# Altium integrated library Connectors.IntLib: 52 symbols
Pins are listed as number, name and electrical type; pins without a type are passive.

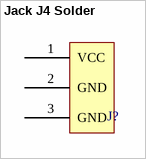
[diagram p0: symbol Jack J4 Solder]

## Jack J4 Solder
designator J?  (value not drawn)
Power Barrel Connector Jack 2.10mm ID (0.083"), 5.50mm OD (0.217") Through Hole, Right Angle; Manufacturer 1: CUI Inc.; Manufacturer 1 PN: PJ-002A; Supplier 1: Digi-Key; Supplier 2: Arrow; Supplier 3: Mouser; Supplier Part Number 1: CP-002A-ND; Supplier Part Number 2: PJ-002A; Supplier Part Number 3: 490-PJ-002A
footprint Jack J4 Solder (Power Barrel Connector Jack 2.10mm ID (0.083"), 5.50mm OD (0.217") Through Hole, Right Angle)
pins: 1 VCC (power), 2 GND (power), 3 GND (power)


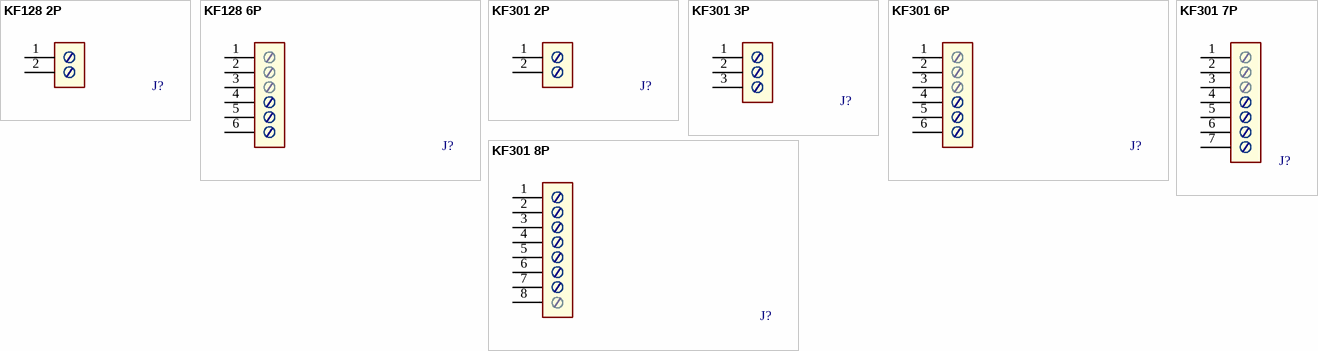
[diagram p1: symbols KF128 2P to KF301 8P]

## KF128 2P
designator J?, comment 2-Ways Wire-to-Board Horizontal  (value not drawn)
2 Position Wire to Board Terminal Block Horizontal with Board 0.200" (5.08mm) Through Hole; Manufacturer 1: Amphenol Anytek; Manufacturer 1 PN: VI0221520000G; ComponentLink1Description: Datasheet; ComponentLink1URL: http://www.on-shore.com/wp-content/uploads/2015/09/OSTTAXX4163.pdf; Digikey PN: 609-3936-ND; Mouser PN: 649-VI02215200J0G
footprint KF128 2P (2 Position Wire to Board Terminal Block Horizontal with Board 0.200" (5.08mm) Through Hole)
pins: 1, 2

## KF128 6P
designator J?, comment 6-Ways Wire-to-Board Horizontal  (value not drawn)
6 Position Wire to Board Terminal Block Horizontal with Board 0.200" (5.08mm) Through Hole; Manufacturer 1: Amphenol Anytek; Manufacturer 1 PN: VI0621550000G; ComponentLink1Description: Datasheet; ComponentLink1URL: http://www.on-shore.com/wp-content/uploads/2015/09/ed120ds.pdf; Digikey PN: 609-3940-ND; Mouser PN: 649-220316-H061B01LF
footprint KF128 6P (6 Position Wire to Board Terminal Block Horizontal with Board 0.200" (5.08mm) Through Hole)
pins: 1 (power), 2 (power), 3 (power), 4 (power), 5 (power), 6 (power)

## KF301 2P
designator J?, comment 2-Ways Wire-to-Board Horizontal  (value not drawn)
2 Position Wire to Board Terminal Block Horizontal with Board 0.200" (5.08mm) Through Hole; Manufacturer 1: On Shore Technology Inc.; Manufacturer 1 PN: OSTTA024163; ComponentLink1Description: Datasheet; ComponentLink1URL: http://www.on-shore.com/wp-content/uploads/2015/09/OSTTAXX4163.pdf; Digikey PN: ED2580-ND
footprint KF301 2P (2 Position Wire to Board Terminal Block Horizontal with Board 0.200" (5.08mm) Through Hole)
pins: 1, 2

## KF301 3P
designator J?, comment 3-Ways Wire-to-Board Horizontal  (value not drawn)
3 Position Wire to Board Terminal Block Horizontal with Board 0.200" (5.08mm) Through Hole; Manufacturer 1: On Shore Technology Inc.; Manufacturer 1 PN: OSTTC032162; ComponentLink1Description: Datasheet; ComponentLink1URL: http://www.on-shore.com/wp-content/uploads/2015/09/ed120ds.pdf; Digikey PN: ED2610-ND
footprint KF301 3P (3 Position Wire to Board Terminal Block Horizontal with Board 0.200" (5.08mm) Through Hole)
pins: 1, 2, 3 (power)

## KF301 6P
designator J?, comment 6-Ways Wire-to-Board Horizontal  (value not drawn)
6 Position Wire to Board Terminal Block Horizontal with Board 0.200" (5.08mm) Through Hole; Manufacturer 1: On Shore Technology Inc.; Manufacturer 1 PN: OSTTC062162; ComponentLink1Description: Datasheet; ComponentLink1URL: http://www.on-shore.com/wp-content/uploads/2015/09/ed120ds.pdf; Digikey PN: ED2613-ND
footprint KF301 6P (6 Position Wire to Board Terminal Block Horizontal with Board 0.200" (5.08mm) Through Hole)
pins: 1 (power), 2 (power), 3 (power), 4 (power), 5 (power), 6 (power)

## KF301 7P
designator J?, comment 7-Ways Wire-to-Board Horizontal  (value not drawn)
7 Position Wire to Board Terminal Block Horizontal with Board 0.200" (5.08mm) Through Hole; Manufacturer 1: On Shore Technology Inc.; Manufacturer 1 PN: OSTTC072162; ComponentLink1Description: Datasheet; ComponentLink1URL: http://www.on-shore.com/wp-content/uploads/2015/09/ed120ds.pdf; Digikey PN: ED2614-ND
footprint KF301 7P (7 Position Wire to Board Terminal Block Horizontal with Board 0.200" (5.08mm) Through Hole)
pins: 1 (power), 2 (power), 3 (power), 4 (power), 5 (power), 6 (power), 7 (power)

## KF301 8P
designator J?, comment 8-Ways Wire-to-Board Horizontal  (value not drawn)
8 Position Wire to Board Terminal Block Horizontal with Board 0.200" (5.08mm) Through Hole; Manufacturer 1: On Shore Technology Inc.; Manufacturer 1 PN: OSTTC082162; ComponentLink1Description: Datasheet; ComponentLink1URL: http://www.on-shore.com/wp-content/uploads/2015/09/ed120ds.pdf; Digikey PN: ED2615-ND
footprint KF301 8P (8 Position Wire to Board Terminal Block Horizontal with Board 0.200" (5.08mm) Through Hole)
pins: 1 (power), 2 (power), 3 (power), 4 (power), 5 (power), 6 (power), 7 (power), 8 (power)


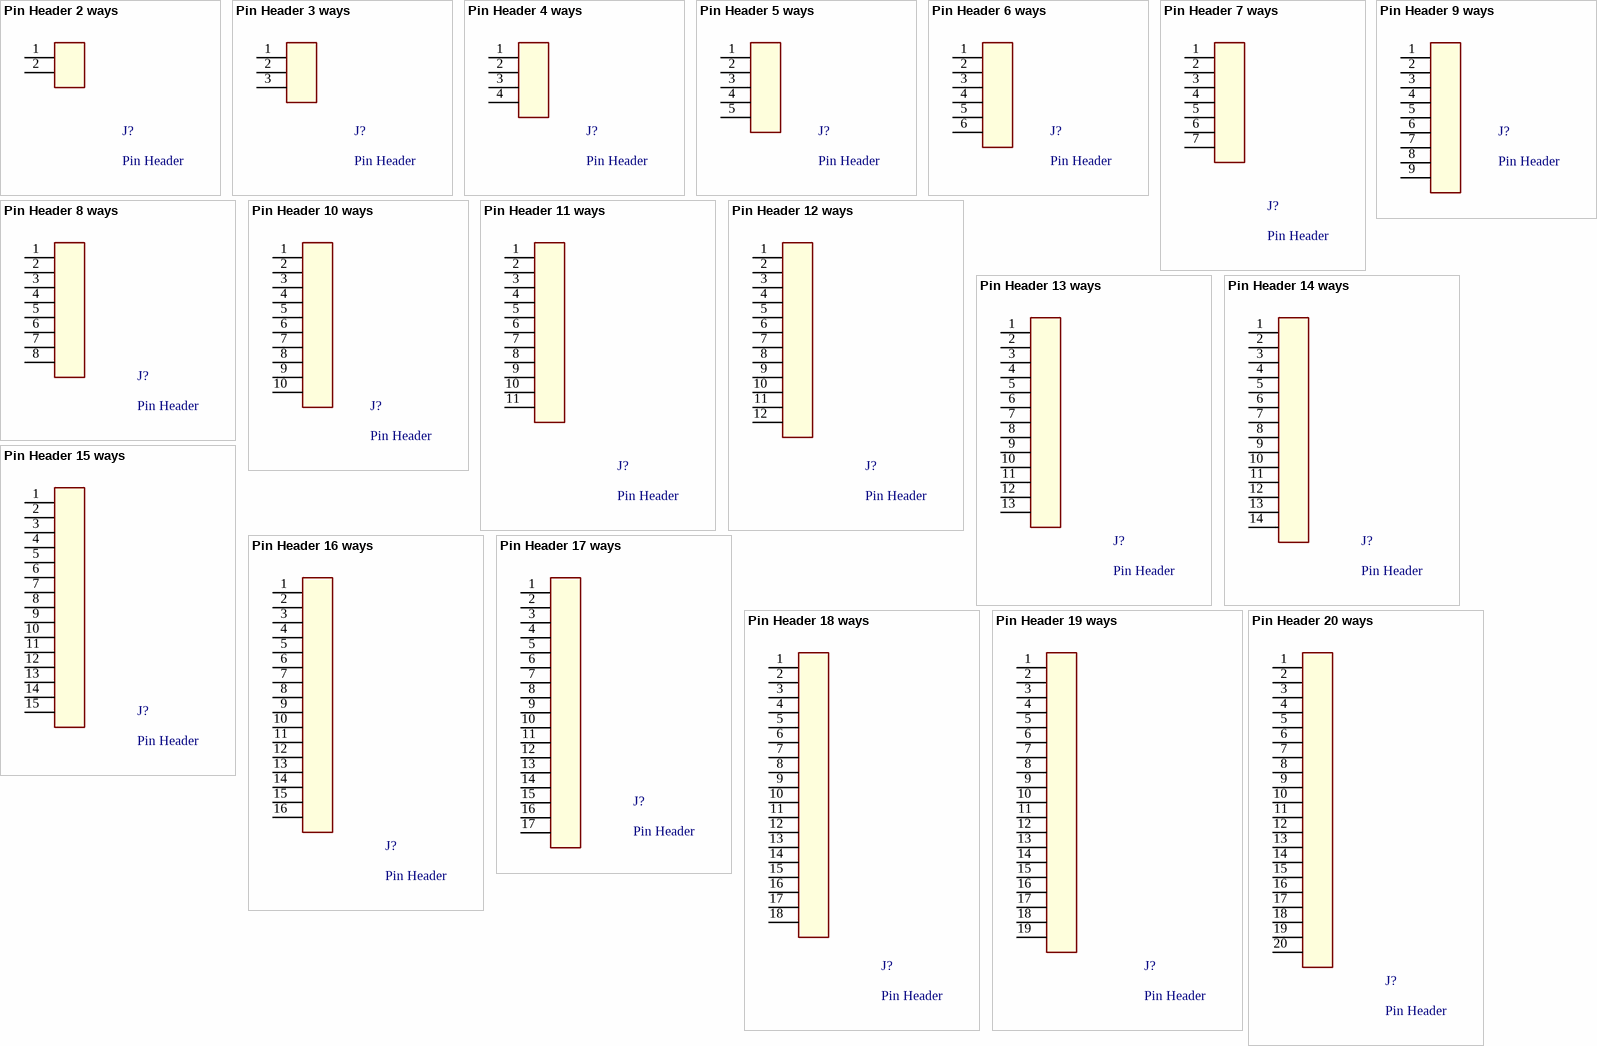
[diagram p2: symbols Pin Header 2 ways to Pin Header 20 ways]

## Pin Header 2 ways
designator J?, comment Pin Header
Connector Header PTH 0.100" (2.54mm); Manufacturer 1: Irwin Inc.; Manufacturer 1 PN: M20-9992046
footprint Pin Header 2 ways (Connector Header 2 ways PTH 0.100" (2.54mm))
pins: 1, 2

## Pin Header 3 ways
designator J?, comment Pin Header
Connector Header PTH 0.100" (2.54mm); Manufacturer 1: Irwin Inc.; Manufacturer 1 PN: M20-9992046
footprint Pin Header 3 Ways (Connector Header 3 ways PTH 0.100" (2.54mm))
pins: 1, 2, 3

## Pin Header 4 ways
designator J?, comment Pin Header
Connector Header PTH 0.100" (2.54mm); Manufacturer 1: Irwin Inc.; Manufacturer 1 PN: M20-9992046
footprint Pin Header 4 Ways (Connector Header 4 ways PTH 0.100" (2.54mm))
pins: 1, 2, 3, 4

## Pin Header 5 ways
designator J?, comment Pin Header
Connector Header PTH 0.100" (2.54mm); Manufacturer 1: Irwin Inc.; Manufacturer 1 PN: M20-9992046
footprint Pin Header 5 Ways (Connector Header 5 ways PTH 0.100" (2.54mm))
pins: 1, 2, 3, 4, 5

## Pin Header 6 ways
designator J?, comment Pin Header
Connector Header PTH 0.100" (2.54mm); Manufacturer 1: Irwin Inc.; Manufacturer 1 PN: M20-9992046
footprint Pin Header 6 Ways (Connector Header 6 ways PTH 0.100" (2.54mm))
pins: 1, 2, 3, 4, 5, 6

## Pin Header 7 ways
designator J?, comment Pin Header
Connector Header PTH 0.100" (2.54mm); Manufacturer 1: Irwin Inc.; Manufacturer 1 PN: M20-9992046
footprint Pin Header 7 Ways (Connector Header 7 ways PTH 0.100" (2.54mm))
pins: 1, 2, 3, 4, 5, 6, 7

## Pin Header 8 ways
designator J?, comment Pin Header
Connector Header PTH 0.100" (2.54mm); Manufacturer 1: Irwin Inc.; Manufacturer 1 PN: M20-9992046
footprint Pin Header 8 Ways (Connector Header 8 ways PTH 0.100" (2.54mm))
pins: 1, 2, 3, 4, 5, 6, 7, 8

## Pin Header 9 ways
designator J?, comment Pin Header
Connector Header PTH 0.100" (2.54mm); Manufacturer 1: Irwin Inc.; Manufacturer 1 PN: M20-9992046
footprint Pin Header 9 Ways (Connector Header 9 ways PTH 0.100" (2.54mm))
pins: 1, 2, 3, 4, 5, 6, 7, 8, 9

## Pin Header 10 ways
designator J?, comment Pin Header
Connector Header PTH 0.100" (2.54mm); Manufacturer 1: Irwin Inc.; Manufacturer 1 PN: M20-9992046
footprint Pin Header 10 Ways (Connector Header 10 ways PTH 0.100" (2.54mm))
pins: 1, 2, 3, 4, 5, 6, 7, 8, 9, 10

## Pin Header 11 ways
designator J?, comment Pin Header
Connector Header PTH 0.100" (2.54mm); Manufacturer 1: Irwin Inc.; Manufacturer 1 PN: M20-9992046
footprint Pin Header 11 Ways (Connector Header 11 ways PTH 0.100" (2.54mm))
pins: 1, 2, 3, 4, 5, 6, 7, 8, 9, 10, 11

## Pin Header 12 ways
designator J?, comment Pin Header
Connector Header PTH 0.100" (2.54mm); Manufacturer 1: Irwin Inc.; Manufacturer 1 PN: M20-9992046
footprint Pin Header 12 Ways (Connector Header 12 ways PTH 0.100" (2.54mm))
pins: 1, 2, 3, 4, 5, 6, 7, 8, 9, 10, 11, 12

## Pin Header 13 ways
designator J?, comment Pin Header
Connector Header PTH 0.100" (2.54mm); Manufacturer 1: Irwin Inc.; Manufacturer 1 PN: M20-9992046
footprint Pin Header 13 Ways (Connector Header 13 ways PTH 0.100" (2.54mm))
pins: 1, 2, 3, 4, 5, 6, 7, 8, 9, 10, 11, 12, 13

## Pin Header 14 ways
designator J?, comment Pin Header
Connector Header PTH 0.100" (2.54mm); Manufacturer 1: Irwin Inc.; Manufacturer 1 PN: M20-9992046
footprint Pin Header 14 Ways (Connector Header 14 ways PTH 0.100" (2.54mm))
pins: 1, 2, 3, 4, 5, 6, 7, 8, 9, 10, 11, 12, 13, 14

## Pin Header 15 ways
designator J?, comment Pin Header
Connector Header PTH 0.100" (2.54mm); Manufacturer 1: Irwin Inc.; Manufacturer 1 PN: M20-9992046
footprint Pin Header 15 Ways (Connector Header 15 ways PTH 0.100" (2.54mm))
pins: 1, 2, 3, 4, 5, 6, 7, 8, 9, 10, 11, 12, 13, 14, 15

## Pin Header 16 ways
designator J?, comment Pin Header
Connector Header PTH 0.100" (2.54mm); Manufacturer 1: Irwin Inc.; Manufacturer 1 PN: M20-9992046
footprint Pin Header 16 Ways (Connector Header 16 ways PTH 0.100" (2.54mm))
pins: 1, 2, 3, 4, 5, 6, 7, 8, 9, 10, 11, 12, 13, 14, 15, 16

## Pin Header 17 ways
designator J?, comment Pin Header
Connector Header PTH 0.100" (2.54mm); Manufacturer 1: Irwin Inc.; Manufacturer 1 PN: M20-9992046
footprint Pin Header 17 Ways (Connector Header 17 ways PTH 0.100" (2.54mm))
pins: 1, 2, 3, 4, 5, 6, 7, 8, 9, 10, 11, 12, 13, 14, 15, 16, 17

## Pin Header 18 ways
designator J?, comment Pin Header
Connector Header PTH 0.100" (2.54mm); Manufacturer 1: Irwin Inc.; Manufacturer 1 PN: M20-9992046
footprint Pin Header 18 Ways (Connector Header 18 ways PTH 0.100" (2.54mm))
pins: 1, 2, 3, 4, 5, 6, 7, 8, 9, 10, 11, 12, 13, 14, 15, 16, 17, 18

## Pin Header 19 ways
designator J?, comment Pin Header
Connector Header PTH 0.100" (2.54mm); Manufacturer 1: Irwin Inc.; Manufacturer 1 PN: M20-9992046
footprint Pin Header 19 Ways (Connector Header 19 ways PTH 0.100" (2.54mm))
pins: 1, 2, 3, 4, 5, 6, 7, 8, 9, 10, 11, 12, 13, 14, 15, 16, 17, 18, 19

## Pin Header 20 ways
designator J?, comment Pin Header
Connector Header PTH 0.100" (2.54mm); Manufacturer 1: Irwin Inc.; Manufacturer 1 PN: M20-9992046
footprint Pin Header 20 Ways (Connector Header 20 ways PTH 0.100" (2.54mm))
pins: 1, 2, 3, 4, 5, 6, 7, 8, 9, 10, 11, 12, 13, 14, 15, 16, 17, 18, 19, 20


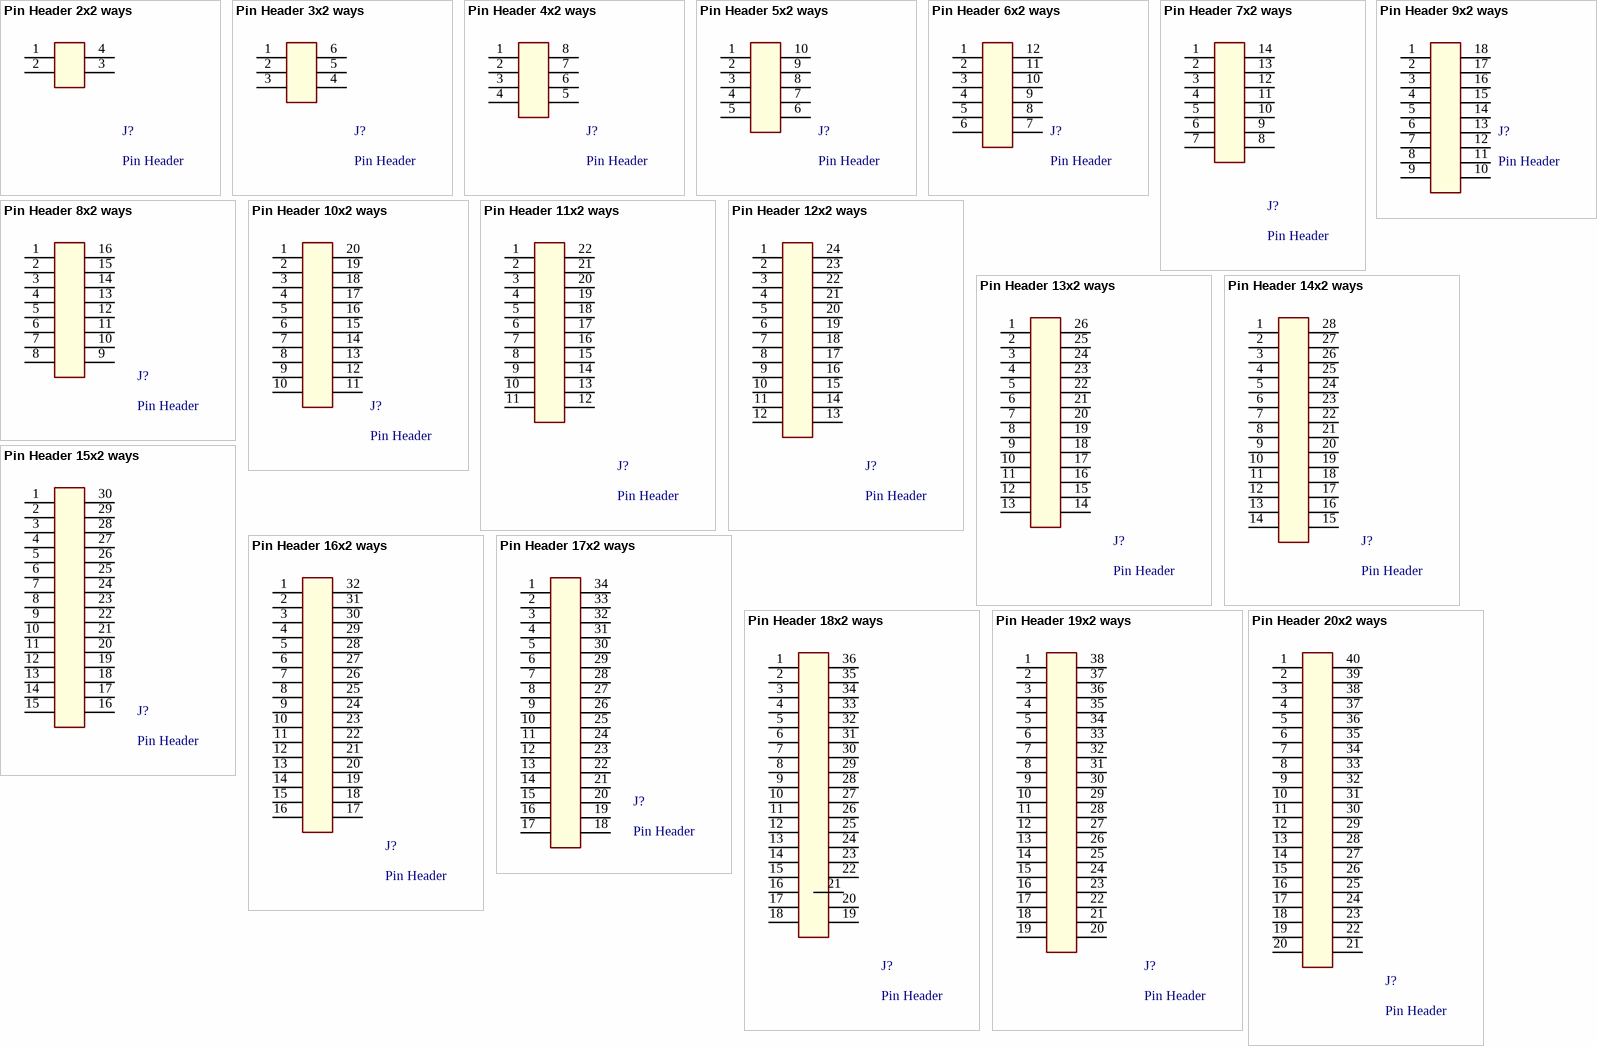
[diagram p3: symbols Pin Header 2x2 ways to Pin Header 20x2 ways]

## Pin Header 2x2 ways
designator J?, comment Pin Header
Connector Header PTH 0.100" (2.54mm); Manufacturer 1: Irwin Inc.; Manufacturer 1 PN: M20-9992046
footprint Pin Header 2x2 ways (Connector Header 2x2 ways PTH 0.100" (2.54mm))
pins: 1, 2, 3, 4

## Pin Header 3x2 ways
designator J?, comment Pin Header
Connector Header PTH 0.100" (2.54mm); Manufacturer 1: Irwin Inc.; Manufacturer 1 PN: M20-9992046
footprint Pin Header 3x2 Ways (Connector Header 3x2 ways PTH 0.100" (2.54mm))
pins: 1, 2, 3, 4, 5, 6

## Pin Header 4x2 ways
designator J?, comment Pin Header
Connector Header PTH 0.100" (2.54mm); Manufacturer 1: Irwin Inc.; Manufacturer 1 PN: M20-9992046
footprint Pin Header 4x2 Ways (Connector Header 4x2 ways PTH 0.100" (2.54mm))
pins: 1, 2, 3, 4, 5, 6, 7, 8

## Pin Header 5x2 ways
designator J?, comment Pin Header
Connector Header PTH 0.100" (2.54mm); Manufacturer 1: Irwin Inc.; Manufacturer 1 PN: M20-9992046
footprint Pin Header 5x2 Ways (Connector Header 5x2 ways PTH 0.100" (2.54mm))
pins: 1, 2, 3, 4, 5, 6, 7, 8, 9, 10

## Pin Header 6x2 ways
designator J?, comment Pin Header
Connector Header PTH 0.100" (2.54mm); Manufacturer 1: Irwin Inc.; Manufacturer 1 PN: M20-9992046
footprint Pin Header 6x2 Ways (Connector Header 6x2 ways PTH 0.100" (2.54mm))
pins: 1, 2, 3, 4, 5, 6, 7, 8, 9, 10, 11, 12

## Pin Header 7x2 ways
designator J?, comment Pin Header
Connector Header PTH 0.100" (2.54mm); Manufacturer 1: Irwin Inc.; Manufacturer 1 PN: M20-9992046
footprint Pin Header 7x2 Ways (Connector Header 7x2 ways PTH 0.100" (2.54mm))
pins: 1, 2, 3, 4, 5, 6, 7, 8, 9, 10, 11, 12, 13, 14

## Pin Header 8x2 ways
designator J?, comment Pin Header
Connector Header PTH 0.100" (2.54mm); Manufacturer 1: Irwin Inc.; Manufacturer 1 PN: M20-9992046
footprint Pin Header 8x2 Ways (Connector Header 8x2 ways PTH 0.100" (2.54mm))
pins: 1, 2, 3, 4, 5, 6, 7, 8, 9, 10, 11, 12, 13, 14, 15, 16

## Pin Header 9x2 ways
designator J?, comment Pin Header
Connector Header PTH 0.100" (2.54mm); Manufacturer 1: Irwin Inc.; Manufacturer 1 PN: M20-9992046
footprint Pin Header 9x2 Ways (Connector Header 9x2 ways PTH 0.100" (2.54mm))
pins: 1, 2, 3, 4, 5, 6, 7, 8, 9, 10, 11, 12, 13, 14, 15, 16, 17, 18

## Pin Header 10x2 ways
designator J?, comment Pin Header
Connector Header PTH 0.100" (2.54mm); Manufacturer 1: Irwin Inc.; Manufacturer 1 PN: M20-9992046
footprint Pin Header 10x2 Ways (Connector Header 10x2 ways PTH 0.100" (2.54mm))
pins: 1, 2, 3, 4, 5, 6, 7, 8, 9, 10, 11, 12, 13, 14, 15, 16, 17, 18, 19, 20

## Pin Header 11x2 ways
designator J?, comment Pin Header
Connector Header PTH 0.100" (2.54mm); Manufacturer 1: Irwin Inc.; Manufacturer 1 PN: M20-9992046
footprint Pin Header 11x2 Ways (Connector Header 11x2 ways PTH 0.100" (2.54mm))
pins: 1, 2, 3, 4, 5, 6, 7, 8, 9, 10, 11, 12, 13, 14, 15, 16, 17, 18, 19, 20, 21, 22

## Pin Header 12x2 ways
designator J?, comment Pin Header
Connector Header PTH 0.100" (2.54mm); Manufacturer 1: Irwin Inc.; Manufacturer 1 PN: M20-9992046
footprint Pin Header 12x2 Ways (Connector Header 12x2 ways PTH 0.100" (2.54mm))
pins: 1, 2, 3, 4, 5, 6, 7, 8, 9, 10, 11, 12, 13, 14, 15, 16, 17, 18, 19, 20, 21, 22, 23, 24

## Pin Header 13x2 ways
designator J?, comment Pin Header
Connector Header PTH 0.100" (2.54mm); Manufacturer 1: Irwin Inc.; Manufacturer 1 PN: M20-9992046
footprint Pin Header 13x2 Ways (Connector Header 13x2 ways PTH 0.100" (2.54mm))
pins: 1, 2, 3, 4, 5, 6, 7, 8, 9, 10, 11, 12, 13, 14, 15, 16, 17, 18, 19, 20, 21, 22, 23, 24, 25, 26

## Pin Header 14x2 ways
designator J?, comment Pin Header
Connector Header PTH 0.100" (2.54mm); Manufacturer 1: Irwin Inc.; Manufacturer 1 PN: M20-9992046
footprint Pin Header 14x2 Ways (Connector Header 14x2 ways PTH 0.100" (2.54mm))
pins: 1, 2, 3, 4, 5, 6, 7, 8, 9, 10, 11, 12, 13, 14, 15, 16, 17, 18, 19, 20, 21, 22, 23, 24, 25, 26, 27, 28

## Pin Header 15x2 ways
designator J?, comment Pin Header
Connector Header PTH 0.100" (2.54mm); Manufacturer 1: Irwin Inc.; Manufacturer 1 PN: M20-9992046
footprint Pin Header 15x2 Ways (Connector Header 15x2 ways PTH 0.100" (2.54mm))
pins: 1, 2, 3, 4, 5, 6, 7, 8, 9, 10, 11, 12, 13, 14, 15, 16, 17, 18, 19, 20, 21, 22, 23, 24, 25, 26, 27, 28, 29, 30

## Pin Header 16x2 ways
designator J?, comment Pin Header
Connector Header PTH 0.100" (2.54mm); Manufacturer 1: Irwin Inc.; Manufacturer 1 PN: M20-9992046
footprint Pin Header 16x2 Ways (Connector Header 16x2 ways PTH 0.100" (2.54mm))
pins: 1, 2, 3, 4, 5, 6, 7, 8, 9, 10, 11, 12, 13, 14, 15, 16, 17, 18, 19, 20, 21, 22, 23, 24, 25, 26, 27, 28, 29, 30, 31, 32

## Pin Header 17x2 ways
designator J?, comment Pin Header
Connector Header PTH 0.100" (2.54mm); Manufacturer 1: Irwin Inc.; Manufacturer 1 PN: M20-9992046
footprint Pin Header 17x2 Ways (Connector Header 17x2 ways PTH 0.100" (2.54mm))
pins: 1, 2, 3, 4, 5, 6, 7, 8, 9, 10, 11, 12, 13, 14, 15, 16, 17, 18, 19, 20, 21, 22, 23, 24, 25, 26, 27, 28, 29, 30, 31, 32, 33, 34

## Pin Header 18x2 ways
designator J?, comment Pin Header
Connector Header PTH 0.100" (2.54mm); Manufacturer 1: Irwin Inc.; Manufacturer 1 PN: M20-9992046
footprint Pin Header 18x2 Ways (Connector Header 18x2 ways PTH 0.100" (2.54mm))
pins: 1, 2, 3, 4, 5, 6, 7, 8, 9, 10, 11, 12, 13, 14, 15, 16, 17, 18, 19, 20, 21, 22, 23, 24, 25, 26, 27, 28, 29, 30, 31, 32, 33, 34, 35, 36

## Pin Header 19x2 ways
designator J?, comment Pin Header
Connector Header PTH 0.100" (2.54mm); Manufacturer 1: Irwin Inc.; Manufacturer 1 PN: M20-9992046
footprint Pin Header 19x2 Ways (Connector Header 19x2 ways PTH 0.100" (2.54mm))
pins: 1, 2, 3, 4, 5, 6, 7, 8, 9, 10, 11, 12, 13, 14, 15, 16, 17, 18, 19, 20, 21, 22, 23, 24, 25, 26, 27, 28, 29, 30, 31, 32, 33, 34, 35, 36, 37, 38

## Pin Header 20x2 ways
designator J?, comment Pin Header
Connector Header PTH 0.100" (2.54mm); Manufacturer 1: Irwin Inc.; Manufacturer 1 PN: M20-9992046
footprint Pin Header 20x2 Ways (Connector Header 20x2 ways PTH 0.100" (2.54mm))
pins: 1, 2, 3, 4, 5, 6, 7, 8, 9, 10, 11, 12, 13, 14, 15, 16, 17, 18, 19, 20, 21, 22, 23, 24, 25, 26, 27, 28, 29, 30, 31, 32, 33, 34, 35, 36, 37, 38, 39, 40


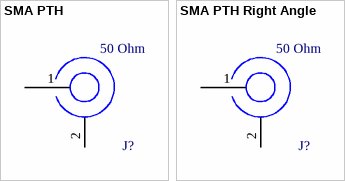
[diagram p4: symbols SMA PTH to SMA PTH Right Angle]

## SMA PTH
designator J?  Impedance: 50 Ohm  (hidden comment: SMA PTH)
SMA Connector Jack, Female Socket 50 Ohm Through Hole Solder; ComponentLink1Description: Datasheet; ComponentLink1URL: https://www.te.com/commerce/DocumentDelivery/DDEController?Action=srchrtrv&DocNm=1814832&DocType=Customer+Drawing&DocLang=English; Digikey PN: *; Manufacturer 1: *; Manufacturer 1 PN: *; Mouser PN: *; Notes: *
footprint SMA PTH (SMA Connector Jack, Female Socket 50 Ohm Through Hole Solder)
pins: 1 (power), 2 (power)

## SMA PTH Right Angle
designator J?  Impedance: 50 Ohm  (hidden comment: SMA PTH Right Angle)
SMA Connector Jack, Female Socket 50 Ohm Through Hole, Right Angle Solder; Manufacturer 1: TE Connectivity AMP Connectors; Manufacturer 1 PN: 5-1814400-1; Digikey PN: A97593-ND; Mouser PN: 571-5-1814400-1; ComponentLink1Description: Datasheet; ComponentLink1URL: https://www.te.com/commerce/DocumentDelivery/DDEController?Action=srchrtrv&DocNm=1814400&DocType=Customer+Drawing&DocLang=English
footprint SMA PTH Right Angle (SMA Connector Jack, Female Socket 50 Ohm Through Hole, Right Angle Solder)
pins: 1 (power), 2 (power)


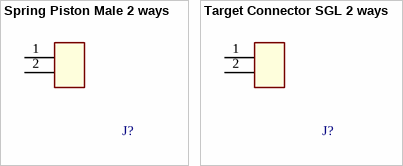
[diagram p5: symbols Spring Piston Male 2 ways to Target Connector SGL 2 ways]

## Spring Piston Male 2 ways
designator J?, comment Spring Piston Male  (value not drawn)
2 Position Spring Piston Connector Through Hole 0.100' pitch; Manufacturer 1: Mill-Max Manufacturing Corp.; Manufacturer 1 PN: 825-22-064-10-001101; Notes: Attention to amount to buy. It sells in 64pos/unit; ComponentLink1Description: Datasheet; ComponentLink1URL: https://www.mill-max.com/assets/pdfs/014.pdf; Digikey PN: ED90382-ND; Mouser PN: 575-82522064100011
footprint Spring Piston Male 2 ways (2 Position Spring Piston Male Connector Through Hole)
pins: 1, 2

## Target Connector SGL 2 ways
designator J?, comment Target Connector SGL  (value not drawn)
64 Position Spring Mating Target Connector Through Hole, Right Angle; Manufacturer 1: Mill-Max Manufacturing Corp.; Manufacturer 1 PN: 399-10-164-10-008000; Notes: Attention to amount to buy. It sells in 64pos/unit; ComponentLink1Description: Datasheet; ComponentLink1URL: https://www.mill-max.com/assets/pdfs/014.pdf; Digikey PN: ED8364-64-ND; Mouser PN: 575-39910164
footprint Target Connector SGL 2 ways (64 Position Spring Mating Target Connector Through Hole, Right Angle)
pins: 1, 2


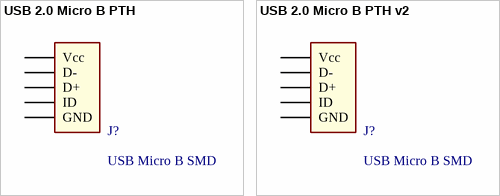
[diagram p6: symbols USB 2.0 Micro B PTH to USB 2.0 Micro B PTH v2]

## USB 2.0 Micro B PTH
designator J?, comment USB Micro B SMD
USB - micro B USB 2.0 Receptacle Connector 5 Position Surface Mount, Right Angle; Through Hole; Manufacturer 1: Amphenol FCI; Manufacturer 1 PN: 10118193-0001LF; ComponentLink1Description: Datasheet; ComponentLink1URL: https://cdn.amphenol-icc.com/media/wysiwyg/files/documentation/datasheet/inputoutput/io_usb_micro.pdf; ComponentLink2Description: Drawing; ComponentLink2URL: https://www.amphenol-icc.com/media/wysiwyg/files/drawing/10118193.pdf; Digikey PN: 609-4616-1-ND
footprint USB 2.0 Micro B PTH (USB - micro B USB 2.0 Receptacle Connector 5 Position Surface Mount, Right Angle; Through Hole)
pins: D+, D-, GND, ID, Vcc

## USB 2.0 Micro B PTH v2
designator J?, comment USB Micro B SMD
USB - micro B USB 2.0 Receptacle Connector 5 Position Surface Mount, Right Angle; Through Hole; Manufacturer 1: CUI Inc.; Manufacturer 1 PN: UJ2-MIBH2-4-SMT-TR; ComponentLink1Description: Datasheet; ComponentLink1URL: https://cdn.amphenol-icc.com/media/wysiwyg/files/documentation/datasheet/inputoutput/io_usb_micro.pdf; Digikey PN: 102-4007-1-ND
footprint USB 2.0 Micro B PTH v2 (USB - micro B USB 2.0 Receptacle Connector 5 Position Surface Mount, Right Angle; Through Hole)
pins: D+, D-, GND, ID, Vcc